# Altium footprint library PcbLib.PcbLib: 428 footprints (part 4 of 27)
Each footprint in its own frame and in the unit in brackets; x right, y up, seen from the top. Pads: shape width x height; smd on the part's side, far side on the other; paste and mask are expansions set on the pad; w line width, h text height; cw(c..) or ccw(c..) is an arc to the next point about the centre after c.
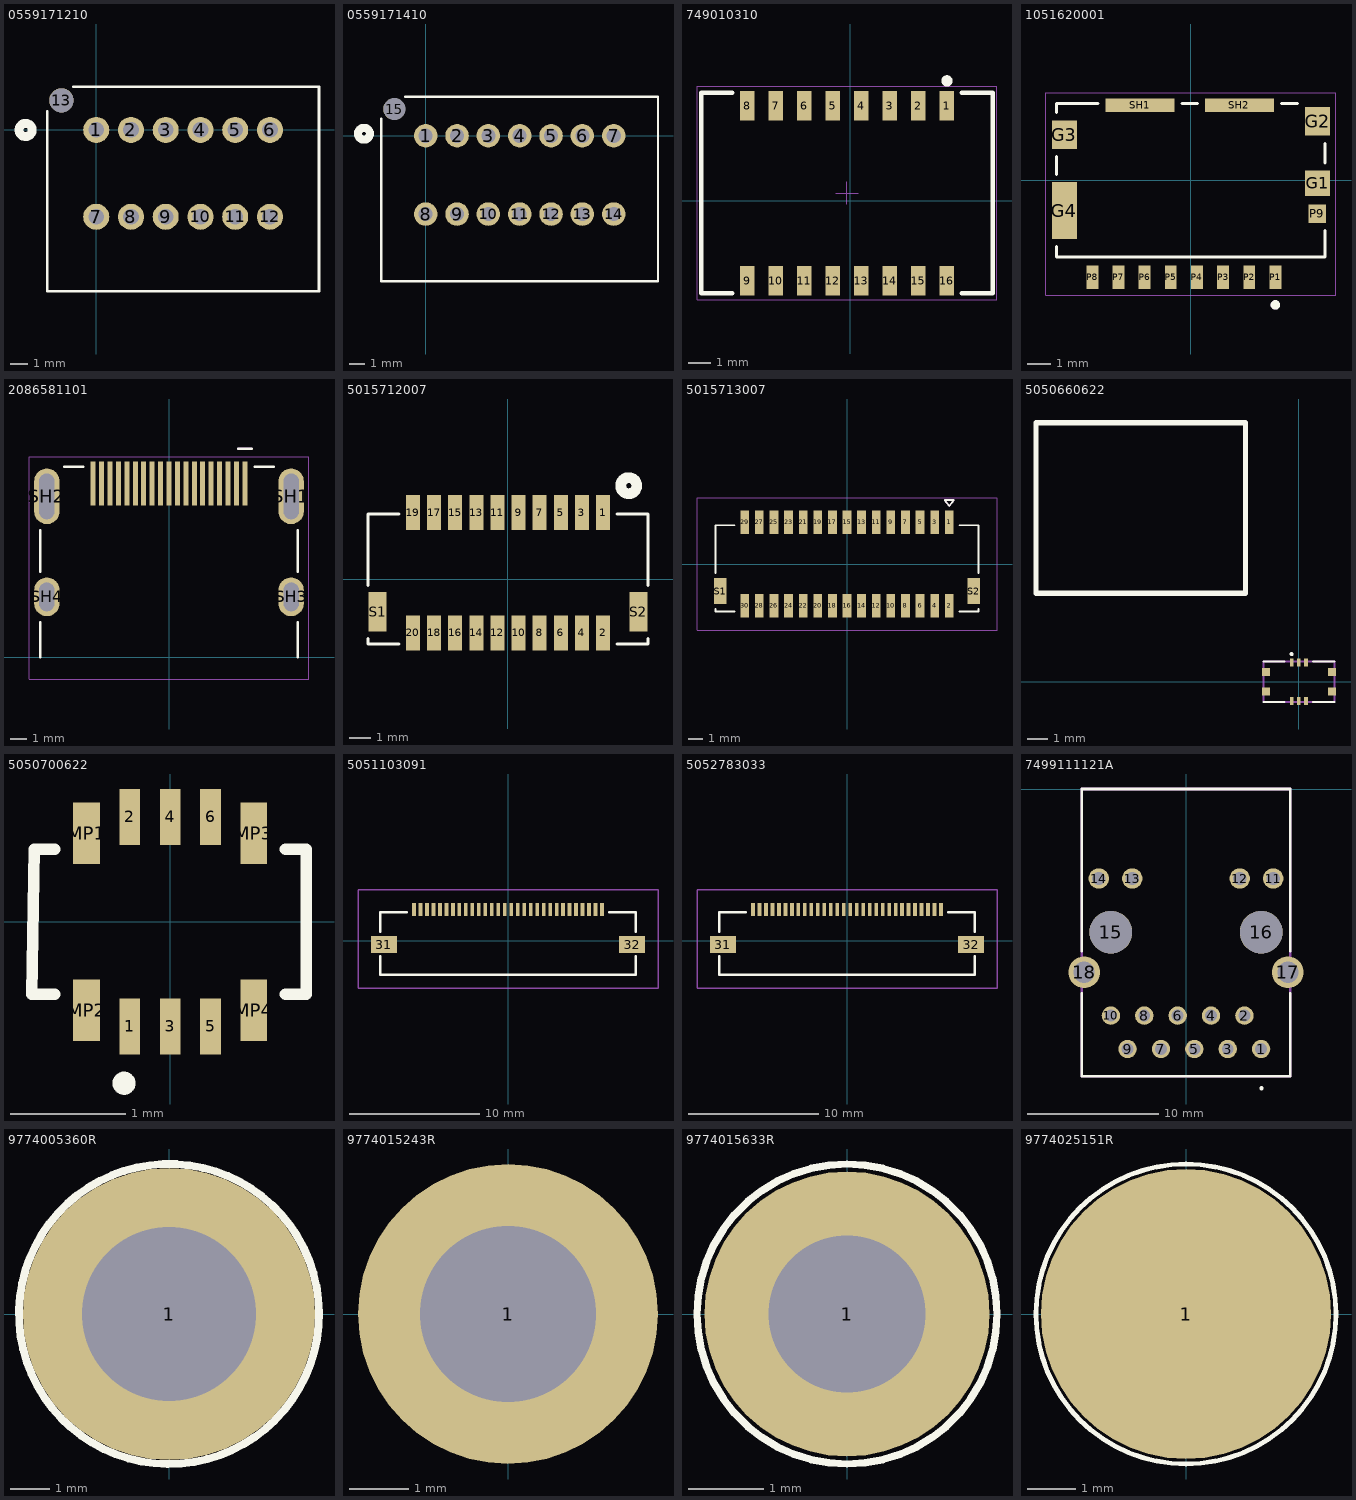
[diagram p3: the footprints below, top view; thin cyan lines are the x and y axes]

## 0559171210 [mm]
pads (13):
  round 1.5 hole 0.9 paste-2539.97 mask+0: 1(0,0) 2(2,0) 3(4,0) 4(6,0) 5(8,0) 6(10,0) 7(0,-5) 8(2,-5) 9(4,-5) 10(6,-5) 11(8,-5) 12(10,-5)
  round 1.397 / inner round 1.524 / far side round 1.397 hole 1.397 unplated paste-2539.97 mask+0: 13(-2,1.7)
Top Overlay:
  circle w0.508: c-4.064,0 r0.381
  lines w0.152: -2.823,1.079 -2.823,-9.277 12.823,-9.277 12.823,2.477 -1.322,2.477
3D body "559171210.stp": height 9.75, standoff -3.2, extent -2.671,-9.138 12.729,2.362

## 0559171410 [mm]
pads (15):
  round 1.5 hole 0.9 paste-2539.97 mask+0: 1(0,0) 2(2,0) 3(4,0) 4(6,0) 5(8,0) 6(10,0) 7(12,0) 8(0,-5) 9(2,-5) 10(4,-5) 11(6,-5) 12(8,-5) 13(10,-5) 14(12,-5)
  round 1.397 / inner round 1.524 / far side round 1.397 hole 1.397 unplated paste-2539.97 mask+0: 15(-2,1.7)
Top Overlay:
  circle w0.508: c-3.937,0.127 r0.381
  lines w0.152: -2.826,1.083 -2.826,-9.277 14.827,-9.277 14.827,2.477 -1.322,2.477
3D body "559171410.stp": height 9.75, standoff -3.2, extent -2.68,-9.138 14.72,2.362

## 749010310 [mm] "10/100 Base-T SMD Transformer 1 Port, body 12.95x8.92mm"
pads (16):
  rect 0.64x1.32 smd: 1(4.31,4.231) 2(3.04,4.231) 3(1.77,4.231) 4(0.5,4.231) 5(-0.77,4.231) 6(-2.04,4.231) 7(-3.31,4.231) 8(-4.58,4.231) 9(-4.58,-3.549) 10(-3.31,-3.549) 11(-2.04,-3.549) 12(-0.77,-3.549) 13(0.5,-3.549) 14(1.77,-3.549) 15(3.04,-3.549) 16(4.31,-3.549)
Top Overlay:
  circle w0.25: c4.31,5.341 r0.125
  lines w0.2: -5.235,-4.119 -6.61,-4.119 -6.61,4.801 -5.235,4.801 ; 4.965,-4.119 6.34,-4.119 6.34,4.801 4.965,4.801
Top Courtyard:
  lines w0.05: -6.81,-4.409 -6.81,5.091 6.54,5.091 6.54,-4.409 -6.81,-4.409
Top Component Center:
  lines w0.05: -0.635,0.341 0.365,0.341 ; -0.135,-0.159 -0.135,0.841
3D body "749010310.stp": height 3.75, standoff 0, extent -6.485,-3.994 6.215,4.676

## 1051620001 [mm]
height 1.45
pads (15):
  rect 1.05x1.08 smd: G1(5.34,-0.135)
  rect 1.05x1.2 smd: G2(5.34,2.475) G3(-5.31,1.905)
  rect 1.05x2.39 smd: G4(-5.31,-1.28)
  rect 0.5x1 smd: P1(3.565,-4.085) P2(2.465,-4.085) P3(1.365,-4.085) P4(0.265,-4.085) P5(-0.835,-4.085) P6(-1.935,-4.085) P7(-3.035,-4.085) P8(-4.135,-4.085)
  rect 0.72x0.78 smd: P9(5.325,-1.405)
  rect 2.91x0.55 smd: SH1(-2.13,3.15) SH2(2.05,3.15)
Top Overlay:
  circle w0.2: c3.565,-5.25 r0.1
  lines w0.127: -5.65,-2.8 -5.65,-3.225 5.65,-3.225 5.65,-2.11 ; -5.65,0.23 -5.65,0.99 ; -5.65,2.85 -5.65,3.225 -3.9,3.225 ; -0.36,3.225 0.28,3.225 ; 3.82,3.225 4.5,3.225 ; 5.65,0.72 5.65,1.55
Mechanical 13:
  circle w0.2: c3.565,-5.25 r0.1
Mechanical 15:
  lines w0.05: -6.085,-4.835 6.115,-4.835 6.115,3.675 -6.085,3.675 -6.085,-4.835
3D body "1051620001--3DModel-STEP-269445.STEP": height 1.45, standoff 0, extent -5.625,-4.394 5.675,3.206

## 2086581101 [mm]
height 6.19
pads (23):
  rect 0.298x2.6 smd: 1(4.5,10.31) 2(4,10.31) 3(3.5,10.31) 4(3,10.31) 5(2.5,10.31) 6(2,10.31) 7(1.5,10.31) 8(1,10.31) 9(0.5,10.31) 10(0,10.31) 11(-0.5,10.31) 12(-1,10.31) 13(-1.5,10.31) 14(-2,10.31) 15(-2.5,10.31) 16(-3,10.31) 17(-3.5,10.31) 18(-4,10.31) 19(-4.5,10.31)
  oval 1.5x3.3 hole 0.9 slot 2.7 at 90 deg mask+0.064: SH1(7.25,9.55) SH2(-7.25,9.55)
  oval 1.5x2.3 hole 0.9 slot 1.7 at 90 deg mask+0.064: SH3(7.25,3.59) SH4(-7.25,3.59)
Top Overlay:
  lines w0.15: -7.65,0 -7.65,2.075 ; -7.65,5.09 -7.65,7.55 ; -6.2,11.3 -5.1,11.3 ; 4.1,12.375 4.9,12.375 ; 5.1,11.3 6.2,11.3 ; 7.65,0 7.65,2.075 ; 7.65,5.09 7.65,7.55
Mechanical 13:
  lines w0.13: 4.1,12.375 4.9,12.375
Mechanical 15:
  lines w0.01: -8.3,-1.3 8.3,-1.3 8.3,11.91 -8.3,11.91 -8.3,-1.3
3D body "2086581101.stp": height 6.21, standoff -1.43, extent -7.49,-0.974 7.51,11.176

## 5015712007 [mil]
pads (22):
  rect 26x65 smd paste+0 mask+0: 1(177.17,123.86) 2(177.17,-100.54) 3(137.8,123.86) 4(137.8,-100.54) 5(98.43,123.86) 6(98.43,-100.54) 7(59.06,123.86) 8(59.06,-100.54) 9(19.68,123.86) 10(19.68,-100.54) 11(-19.68,123.86) 12(-19.68,-100.54) 13(-59.06,123.86) 14(-59.06,-100.54) 15(-98.43,123.86) 16(-98.43,-100.54) 17(-137.8,123.86) 18(-137.8,-100.54) 19(-177.17,123.86) 20(-177.17,-100.54)
  rect 33x73 smd paste+0 mask+0: S1(-243.11,-61.17) S2(243.11,-61.17)
Top Overlay:
  circle w20: c225,174 r15
  lines w6: -261,-110.7 -261,-121 -203.27,-121 ; -261,-11.65 -261,121 -203.27,121 ; 203.27,-121 261,-121 261,-110.7 ; 203.27,121 261,121 261,-11.65
3D body "5015712007.stp": height 325.79, standoff 0.98, extent -255.91,-114.96 255.91,140.94

## 5015713007 [mm]
height 8.25
pads (32):
  rect 0.6x1.6 smd mask+0.076: 1(7,2.85) 2(7,-2.85) 3(6,2.85) 4(6,-2.85) 5(5,2.85) 6(5,-2.85) 7(4,2.85) 8(4,-2.85) 9(3,2.85) 10(3,-2.85) 11(2,2.85) 12(2,-2.85) 13(1,2.85) 14(1,-2.85) 15(0,2.85) 16(0,-2.85) 17(-1,2.85) 18(-1,-2.85) 19(-2,2.85) 20(-2,-2.85) 21(-3,2.85) 22(-3,-2.85) 23(-4,2.85) 24(-4,-2.85) 25(-5,2.85) 26(-5,-2.85) 27(-6,2.85) 28(-6,-2.85) 29(-7,2.85) 30(-7,-2.85)
  rect 0.85x1.8 smd mask+0.076: S1(-8.675,-1.85) S2(8.675,-1.85)
Top Overlay:
  lines w0.127: -9,-3.07 -9,-3.25 -7.7,-3.25 ; -9,-0.63 -9,2.65 -7.7,2.65 ; 7.7,-3.25 9,-3.25 9,-3.07 ; 7.7,2.65 9,2.65 9,-0.63 ; 6.7,4.375 7,3.975 7.3,4.375 6.7,4.375
Mechanical 13:
  lines w0.127: 6.7,4.375 7,3.975 7.3,4.375 6.7,4.375
Mechanical 15:
  lines w0.05: -10.27,-4.52 -10.27,4.52 10.27,4.52 10.27,-4.52 -10.27,-4.52
3D body "5011893010.stp": height 8.51, standoff 1.5, extent -8.35,-4.843 8.35,0.657
3D body "5015713007.stp": height 8.27, standoff 0.02, extent -8.983,-3.326 9.017,3.174

## 5050660622 [mm]
pads (10):
  rect 0.18x0.4 smd: 1(-0.35,0.95) 2(-0.35,-0.95) 3(0,0.95) 4(0,-0.95) 5(0.35,0.95) 6(0.35,-0.95)
  rect 0.4x0.385 smd: MP1(-1.63,-0.482) MP2(1.63,-0.482) MP3(1.63,0.482) MP4(-1.63,0.482)
Top Overlay:
  lines w0.1: -1.75,-1 -0.7,-1 ; -1.75,1 -0.7,1 ; -0.395,1.335 cw(c-0.36,1.37) -0.36,1.32 ; 0.7,-1 1.75,-1 ; 0.7,1 1.75,1
  lines w0.254: -12.97,4.37 -12.97,12.78 -2.63,12.78 -2.63,4.37 -12.97,4.37
Mechanical 15:
  lines w0.102: -1.75,-1 1.75,-1 1.75,1 -1.75,1 -1.75,-1
3D body "505066-0622.stp": height 0.61, standoff 0.03, extent -1.75,-1 1.75,1
3D body "IMU.step": height 3.86, standoff 0.18, extent -11.846,-1.38 1.506,11.658

## 5050700622 [mm]
pads (10):
  rect 0.18x0.485 smd: 1(-0.35,-0.907) 2(-0.35,0.908) 3(0,-0.907) 4(0,0.908) 5(0.35,-0.907) 6(0.35,0.908)
  rect 0.23x0.535 smd: MP1(-0.725,0.768) MP2(-0.725,-0.768) MP3(0.725,0.768) MP4(0.725,-0.768)
Top Overlay:
  circle w0.1: c-0.4,-1.4 r0.05
  lines w0.1: -1,-0.63 -1.2,-0.63 -1.18,0.63 -1,0.63 ; 1,-0.63 1.18,-0.63 1.18,0.63 1,0.63
3D body "5050700622.stp": height 0.46, standoff -0.02, extent -1.18,-1 1.18,1

## 5051103091 [mm]
pads (32):
  rect 0.3x1 smd: 1(-7.25,2.425) 2(-6.75,2.425) 3(-6.25,2.425) 4(-5.75,2.425) 5(-5.25,2.425) 6(-4.75,2.425) 7(-4.25,2.425) 8(-3.75,2.425) 9(-3.25,2.425) 10(-2.75,2.425) 11(-2.25,2.425) 12(-1.75,2.425) 13(-1.25,2.425) 14(-0.75,2.425) 15(-0.25,2.425) 16(0.25,2.425) 17(0.75,2.425) 18(1.25,2.425) 19(1.75,2.425) 20(2.25,2.425) 21(2.75,2.425) 22(3.25,2.425) 23(3.75,2.425) 24(4.25,2.425) 25(4.75,2.425) 26(5.25,2.425) 27(5.75,2.425) 28(6.25,2.425) 29(6.75,2.425) 30(7.25,2.425)
  rect 2x1.3 smd: 31(-9.55,-0.275) 32(9.55,-0.275)
Top Overlay:
  lines w0.2: -9.85,-1.2 -9.85,-2.6 9.85,-2.6 9.85,-1.2 ; -9.85,0.7 -9.85,2.2 -7.8,2.2 ; 7.8,2.2 9.85,2.2 9.85,0.7
Mechanical 15:
  lines w0.1: -11.55,-3.625 11.55,-3.625 11.55,3.925 -11.55,3.925 -11.55,-3.625
3D body "5051103091.stp": height 1.88, standoff -0.02, extent -10.25,-2.7 10.25,2.6

## 5052783033 [mm]
pads (32):
  rect 0.3x1 smd: 1(-7.25,2.425) 2(-6.75,2.425) 3(-6.25,2.425) 4(-5.75,2.425) 5(-5.25,2.425) 6(-4.75,2.425) 7(-4.25,2.425) 8(-3.75,2.425) 9(-3.25,2.425) 10(-2.75,2.425) 11(-2.25,2.425) 12(-1.75,2.425) 13(-1.25,2.425) 14(-0.75,2.425) 15(-0.25,2.425) 16(0.25,2.425) 17(0.75,2.425) 18(1.25,2.425) 19(1.75,2.425) 20(2.25,2.425) 21(2.75,2.425) 22(3.25,2.425) 23(3.75,2.425) 24(4.25,2.425) 25(4.75,2.425) 26(5.25,2.425) 27(5.75,2.425) 28(6.25,2.425) 29(6.75,2.425) 30(7.25,2.425)
  rect 2x1.3 smd: 31(-9.55,-0.275) 32(9.55,-0.275)
Top Overlay:
  lines w0.2: -9.85,-1.2 -9.85,-2.6 9.85,-2.6 9.85,-1.2 ; -9.85,0.7 -9.85,2.2 -7.8,2.2 ; 7.8,2.2 9.85,2.2 9.85,0.7
Mechanical 15:
  lines w0.1: -11.55,-3.625 -11.55,3.925 11.55,3.925 11.55,-3.625 -11.55,-3.625
3D body "505278-3033.stp": height 1.88, standoff -0.02, extent -10.25,-2.6 10.25,2.7

## 7499111121A [mm]
pads (18):
  round 1.4 hole 0.9: 1(5.715,-19.78) 2(4.445,-17.24) 3(3.175,-19.78) 4(1.905,-17.24) 5(0.635,-19.78) 6(-0.635,-17.24) 7(-1.905,-19.78) 8(-3.175,-17.24) 9(-4.445,-19.78) 10(-5.715,-17.24)
  round 1.55 hole 1.02: 11(6.63,-6.81) 12(4.09,-6.81) 13(-4.09,-6.81) 14(-6.63,-6.81)
  round 3.25 hole 3.25 unplated: 15(-5.715,-10.89) 16(5.715,-10.89)
  round 2.4 hole 1.6: 17(7.745,-13.94) 18(-7.745,-13.94)
Top Overlay:
  circle w0.2: c5.737,-22.765 r0.057
  lines w0.2: -7.94,-15.539 -7.94,-21.84 7.94,-21.84 7.94,-15.539 ; -7.94,-12.35 -7.94,0 7.94,0 7.94,-12.35
Mechanical 13:
  lines w0.2: -7.94,-21.84 7.94,-21.84 7.94,0 -7.94,0 -7.94,-21.84
3D body "Download_STP_7499111121A_rev1.stp": height 15.05, standoff -3.4, extent -9.28,-21.265 9.416,-0.015

## 9774005360R [mm]
pads (1):
  round 7.4 / inner round 7.4 / far side round 0.1 hole 4.4: 1(0,0)
Top Overlay:
  lines w0.2: 3.405,1.687 ccw(c0,0) 3.417,1.662
Mechanical 15:
  lines w0.1: -3,0 cw(c0,0) 3,0 cw(c0,0) -3,0
3D body "STP_9774005360 (rev1).stp": height 0.6, standoff -1.3, extent -3,-2.997 2.988,2.997

## 9774015243R [mm]
pads (2):
  round 5.1 smd paste-4: 1(0,0)
  round 3.1 hole 3 unplated: ""(0,0)
Top Paste:
  drawing of 4 lines, arcs and shapes, not listed
Mechanical 15:
  circle w0.127: c0,0 r2.175
3D body "Download_STP_9774015243R_rev1.stp": height 1.55, standoff -1.35, extent -2.175,-2.163 2.175,2.163

## 9774015633R [mm]
pads (1):
  round 3.8 / inner round 2.3 / far side round 2.3 hole 2.1: 1(0,0)
Top Overlay:
  lines w0.1: 0,-2 ccw(c0,0) 0,2 ccw(c0,0) 0,-2
3D body "9774015633R.stp": height 1.6, standoff -0.6, extent -1.65,-1.638 1.65,1.638

## 9774025151R [mm] "RND STNDFF M2.5X0.45 STEEL 2.5MM"
height 0.5
pads (1):
  round 6 smd: 1(0,0)
Top Overlay:
  circle w0.1: c0,0 r3.1
Top Component Outline:
  circle w0.1: c0,0 r2.55
3D body "9774025151R (rev1).stp": height 4, standoff 0.1, extent -2.6,-2.55 2.5,2.55